# Altium integrated library WeAct-ESP32C3CoreBoard-Lib.IntLib: 1 symbol
Pins are listed as number, name and electrical type; pins without a type are passive.

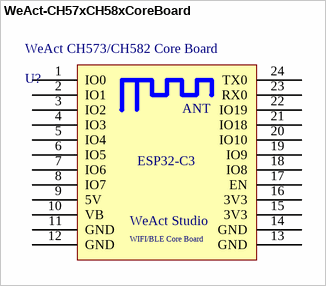
[diagram p0: symbol WeAct-CH57xCH58xCoreBoard]

## WeAct-CH57xCH58xCoreBoard
designator WeAct CH573/CH582 Core Board, comment U?
ComponentLink1Description: WeAct Studio Taobao; ComponentLink1URL: weactstudio.taobao.com; ComponentLink2Description: WeAct Studio Aliexpress; ComponentLink2URL: weactstudio.aliexpress.com; ComponentLink3Description: WeAct Studio Github; ComponentLink3URL: github.com/WeActTC; ComponentLink4Description: WeAct Studio Gitee; ComponentLink4URL: gitee.com/WeAct-TC
footprint WeAct-ESP32C3CoreBoard
pins: 1 IO0, 2 IO1, 3 IO2, 4 IO3, 5 IO4, 6 IO5, 7 IO6, 8 IO7, 9 5V, 10 VB, 11 GND, 12 GND, 13 GND, 14 GND, 15 3V3, 16 3V3, 17 EN, 18 IO8, 19 IO9, 20 IO10, 21 IO18, 22 IO19, 23 RX0, 24 TX0
text: ANT; ESP32-C3; WeAct Studio; WIFI/BLE Core Board